# Altium footprint library CustomCase.PcbLib: 274 footprints (part 15 of 18)
Each footprint in its own frame and in the unit in brackets; x right, y up, seen from the top. Pads: shape width x height; smd on the part's side, far side on the other; paste and mask are expansions set on the pad; w line width, h text height; cw(c..) or ccw(c..) is an arc to the next point about the centre after c.
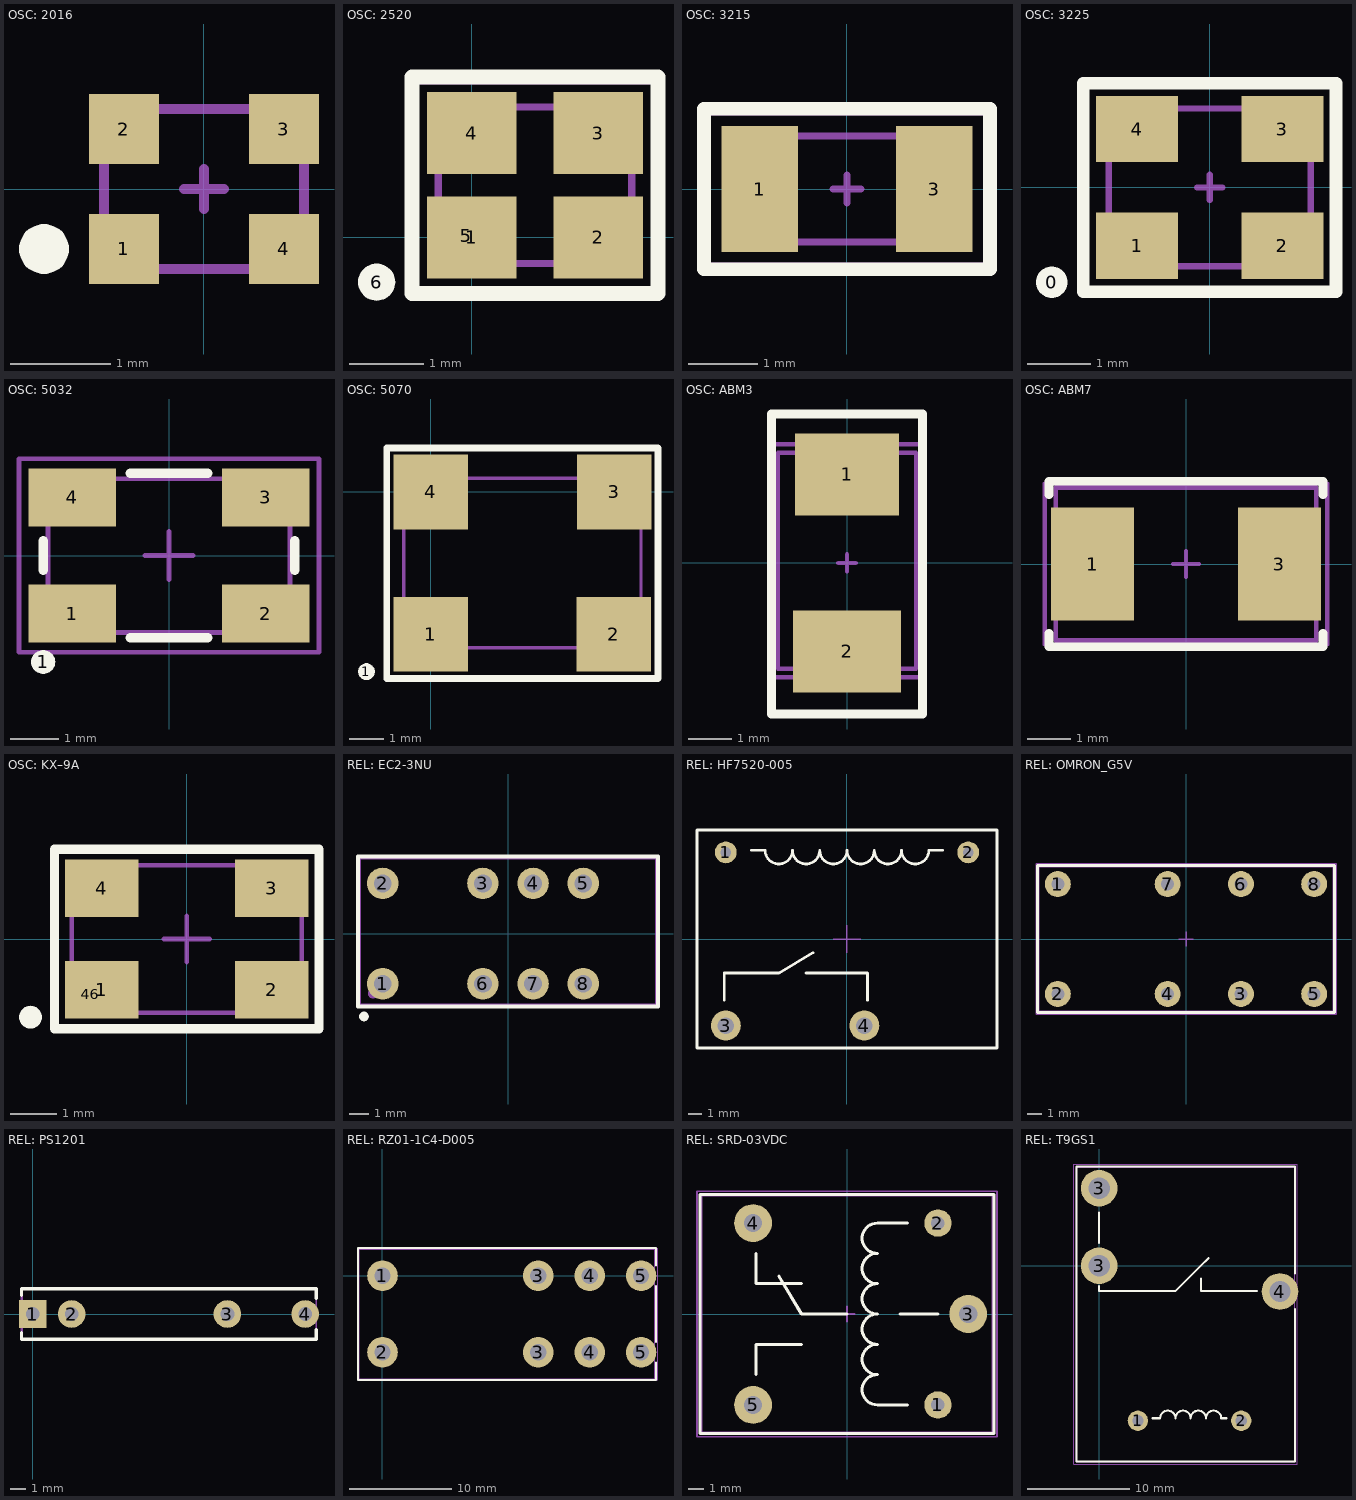
[diagram p14: the footprints below, top view; thin cyan lines are the x and y axes]

## OSC: 2016 [mm]
pads (5):
  rect 0.7x0.7 smd: 1(-0.8,-0.6) 2(-0.8,0.6) 3(0.8,0.6) 4(0.8,-0.6)
  round 0.5 on Top Overlay: ""(-1.6,-0.6)
Top Assy:
  lines w0.1: -1,-0.8 1,-0.8 1,0.8 -1,0.8 -1,-0.8
Size Area:
  lines w0.1: -0.2,0 0.2,0 ; 0,-0.2 0,0.2 ; -1,-0.8 1,-0.8 1,0.8 -1,0.8 -1,-0.8
3D body "User Library-XRCGB27M000F2P00R0.STEP": height 0.65, standoff 0, extent -1,-0.8 1,0.8

## OSC: 2520 [mm]
pads (6):
  rect 1.2x1.1 smd: 1(0,0) 2(1.7,0) 3(1.7,1.4) 4(0,1.4)
  round 0.5 on Mech1: 5(-0.075,0.025)
  round 0.5 on Top Overlay: 6(-1.275,-0.6)
Top Overlay:
  lines w0.2: -0.8,-0.75 -0.8,2.15 2.5,2.15 2.5,-0.75 -0.8,-0.75
Top Assy:
  lines w0.1: -0.45,-0.35 2.15,-0.35 2.15,1.75 -0.45,1.75 -0.45,-0.35
Size Area:
  lines w0.1: -0.8,-0.7 2.5,-0.7 2.5,2.1 -0.8,2.1 -0.8,-0.7
3D body "User Library-Crystal NDK NX2520SA series.STEP": height 0.55, standoff 0, extent -0.45,-0.35 2.15,1.75

## OSC: 3215 [mm]
pads (2):
  rect 1.1x1.8 smd: 1(-1.25,0) 3(1.25,0)
Top Overlay:
  lines w0.2: -2.05,-1.15 -2.05,1.15 2.05,1.15 2.05,-1.15 -2.05,-1.15
Top Assy:
  lines w0.1: -1.61,-0.76 1.61,-0.76 1.61,0.76 -1.61,0.76 -1.61,-0.76
Size Area:
  lines w0.1: -0.2,0 0.2,0 ; 0,-0.2 0,0.2 ; -2.05,-1.1 -2.05,1.1 2.05,1.1 2.05,-1.1 -2.05,-1.1
3D body "User Library-ABS07.STEP": height 0.91, standoff 0, extent -1.61,-0.76 1.61,0.76

## OSC: 3225 [mm]
height 0.55
pads (5):
  round 0.5 on Top Overlay: 0(-2.5,-1.5)
  rect 1.3x1.05 smd: 1(-1.15,-0.925) 2(1.15,-0.925) 3(1.15,0.925) 4(-1.15,0.925)
Top Overlay:
  lines w0.2: -2,-1.65 -2,1.65 2,1.65 2,-1.65 -2,-1.65
Top Assy:
  lines w0.1: -1.6,-1.25 1.6,-1.25 1.6,1.25 -1.6,1.25 -1.6,-1.25
Size Area:
  lines w0.1: -0.2,0 0.2,0 ; 0,-0.2 0,0.2 ; -2,-1.7 2,-1.7 2,1.6 2,1.7 -2,1.7 -2,-1.7
3D body "User Library-User Library-Siward_SX3225.step": height 0.81, standoff 0, extent -1.6,-1.25 1.6,1.25

## OSC: 5032 [mm]
pads (6):
  round 0.5 on Top Overlay: 1(-2.6,-2.2)
  rect 1.8x1.2 smd: 1(-2,-1.2) 2(2,-1.2) 3(2,1.2) 4(-2,1.2)
  round 0.5 on Mech1: ""(-2,-1.1)
Top Overlay:
  lines w0.2: -2.6,-0.3 -2.6,0.3 ; -0.8,-1.7 0.8,-1.7 ; -0.8,1.7 0.8,1.7 ; 2.6,-0.3 2.6,0.3
Top Assy:
  lines w0.1: -2.5,-1.587 -2.5,1.587 2.5,1.587 2.5,-1.587 -2.5,-1.587
Size Area:
  lines w0.1: -0.5,0 0.5,0 ; 0,-0.5 0,0.5 ; -3.1,-2 -3.1,2 3.1,2 3.1,-2 -3.1,-2
3D body "ABM3B.STEP": height 1.1, standoff -0.01, extent -2.5,-1.587 2.5,1.587

## OSC: 5070 [mm]
pads (5):
  round 0.5 on Top Overlay: 1(-1.9,-5.3)
  rect 2.2x2.2 smd: 1(0,-4.2) 2(5.4,-4.2) 3(5.41,0) 4(0,0)
Top Overlay:
  lines w0.2: -1.3,-5.5 -1.3,1.3 6.7,1.3 6.7,-5.5 -1.3,-5.5
Top Assy:
  lines w0.1: -0.8,-4.6 -0.8,0.4 6.2,0.4 6.2,-4.6 -0.8,-4.6
3D body "User Library-50 MHz.STEP": height 1.51, standoff -0.01, extent -0.8,-4.6 6.2,0.4

## OSC: ABM3 [mm] "Quartz"
height 1.5
pads (2):
  rect 2.4x1.9 smd: 1(0,2.05)
  rect 2.5x1.9 smd: 2(0,-2.05)
Top Overlay:
  lines w0.2: -1.75,-3.5 1.75,-3.5 1.75,-3.2 1.75,3.45 -1.75,3.45 -1.75,-3.5
Top Assy:
  lines w0.1: -1.6,-2.45 1.6,-2.45 1.6,2.55 -1.6,2.55 -1.6,-2.45
Size Area:
  lines w0.1: -0.2,0 0.2,0 ; 0,-0.2 0,0.2 ; -1.8,-2.65 -1.8,2.75 1.8,2.75 1.8,-2.65 -1.8,-2.65
3D body "User Library-ABM3-1.STEP": height 1.3, standoff 0, extent -1.6,-2.45 1.6,2.55

## OSC: ABM7 [mm]
pads (2):
  rect 1.9x2.6 smd: 1(-2.15,0) 3(2.15,0)
Top Overlay:
  lines w0.2: -3.15,-1.6 -3.15,-1.9 3.15,-1.9 3.15,-1.6 ; -3.15,1.6 -3.15,1.9 3.15,1.9 3.15,1.6
Top Assy:
  lines w0.1: -2.997,-1.752 -2.997,1.753 2.997,1.753 2.997,-1.752 -2.997,-1.752
Size Area:
  lines w0.1: -0.3,0 0.3,0 ; 0,-0.3 0,0.3 ; -3.25,-1.85 -3.25,1.85 3.25,1.85 3.25,-1.85 -3.25,-1.85
3D body "ABM7.STEP": height 1.4, standoff 0, extent -2.997,-1.752 2.997,1.753

## OSC: KX–9A [mm] "Quartz Crystal  KX–9A"
height 1
pads (6):
  rect 1.6x1.25 smd: 1(-1.85,-1.1) 2(1.85,-1.1) 3(1.85,1.1) 4(-1.85,1.1)
  round 0.5 on Mech1: 46(-2.1,-1.2)
  round 0.5 on Top Overlay: ""(-3.4,-1.7)
Top Overlay:
  lines w0.2: -2.875,-1.95 -2.875,1.95 2.875,1.95 2.875,-1.95 -2.875,-1.95
Top Assy:
  lines w0.1: -2.5,-1.6 2.5,-1.6 2.5,1.6 -2.5,1.6 -2.5,-1.6
Size Area:
  lines w0.1: -0.5,0 0.5,0 ; 0,-0.5 0,0.5 ; -2.85,-1.95 2.85,-1.95 2.85,1.95 -2.85,1.95 -2.85,-1.95
3D body "User Library-GeyerElectronics_KX9A.STEP": height 1.01, standoff 0, extent -2.5,-1.6 2.5,1.6

## REL: EC2-3NU [mm]
pads (10):
  round 1.6 hole 0.9: 1(-6.35,-2.54) 2(-6.35,2.54) 3(-1.27,2.54) 4(1.27,2.54) 5(3.81,2.54) 6(-1.27,-2.54) 7(1.27,-2.54) 8(3.81,-2.54)
  round 0.5 on Top Overlay: ""(-7.3,-4.2)
  round 0.5 on Mech1: ""(-6.85,-3.04)
Top Overlay:
  lines w0.2: -7.6,-3.7 -7.6,3.9 7.6,3.9 7.6,-3.7 -7.6,-3.7
Top Assy:
  lines w0.1: -7.5,-3.59 -7.5,3.81 7.5,3.81 7.5,-3.59 -7.5,-3.59
Size Area:
  lines w0.1: -7.55,-3.64 -7.55,3.86 7.55,3.86 7.55,-3.64 -7.55,-3.64
3D body "User Library-EC2-12.STEP": height 8.2, standoff -3.5, extent -7.5,-3.59 7.5,3.81

## REL: HF7520-005 [mm]
pads (4):
  round 1.6 hole 0.8: 1(-8.89,6.35) 2(8.89,6.35)
  round 2.2 hole 1.2: 3(-8.89,-6.35) 4(1.27,-6.35)
Top Overlay:
  lines w0.2: -9,-4.5 -9,-2.5 -5,-2.5 -2.5,-1 ; -7,6.5 -6,6.5 ccw(c-5,6.5) -4,6.5 ccw(c-3,6.5) -2,6.5 ccw(c-1,6.5) 0,6.5 ccw(c1,6.5) 2,6.5 ccw(c3,6.5) 4,6.5 ; -3,-2.5 1.5,-2.5 1.5,-4.5 ; 4,6.5 ccw(c5,6.5) 6,6.5 7,6.5 ; -11,-8 11,-8 11,8 -11,8 -11,-8
Top Assy:
  lines w0.1: -9,-4.5 -9,-2.5 -5,-2.5 -2.5,-1 ; -7,6.5 -6,6.5 ccw(c-5,6.5) -4,6.5 ccw(c-3,6.5) -2,6.5 ccw(c-1,6.5) 0,6.5 ccw(c1,6.5) 2,6.5 ccw(c3,6.5) 4,6.5 ccw(c5,6.5) 6,6.5 7,6.5 ; -3,-2.5 1.5,-2.5 1.5,-4.5 ; -11,-8 -11,8 11,8 11,-8 -11,-8
Size Area:
  lines w0.1: -11,-8 11,-8 11,8 -11,8 -11,-8 ; -1,0 1,0 ; 0,-1 0,1
3D body "HF7520-005 — копия.SLDPRT": height 10.9, standoff -3.7, extent -11,-8 11,8

## REL: OMRON_G5V [mm] "Omron G5V relay"
height 10
pads (8):
  round 1.8 hole 0.9: 1(-8.89,3.81) 2(-8.89,-3.81) 3(3.81,-3.81) 4(-1.27,-3.81) 5(8.89,-3.81) 6(3.81,3.81) 7(-1.27,3.81) 8(8.89,3.81)
Top Overlay:
  lines w0.2: -10.3,-5.1 10.3,-5.1 10.3,5.1 -10.3,5.1 -10.3,-5.1
Top Assy:
  lines w0.1: -10.2,-5 -10.2,5 10.2,5 10.2,-5 -10.2,-5
Size Area:
  lines w0.1: -0.5,0 0.5,0 ; 0,-0.5 0,0.5 ; -10.4,-5.207 10.4,-5.207 10.4,5.207 -10.4,5.207 -10.4,-5.207
3D body "OMRON G5V-2.step": height 10.92, standoff -4, extent -10.2,-5 10.2,5

## REL: PS1201 [mm]
height 6.35
pads (4):
  rect 1.8x1.8 hole 0.9: 1(0,0)
  round 1.8 hole 0.9: 2(2.54,0) 3(12.7,0) 4(17.78,0)
Top Overlay:
  lines w0.2: -0.75,-1.2 -0.75,-1.65 18.5,-1.65 18.5,-1 ; -0.75,1.2 -0.75,1.65 18.5,1.65 18.5,1
3D model:
  lines w0.1: -0.7,-1.65 18.5,-1.65 18.5,1.65 -0.7,1.65 -0.7,-1.65
Size Area:
  lines w0.05: -0.75,-1.65 18.5,-1.65 18.5,1.65 -0.75,1.65 -0.75,-1.65
3D body "PS1201.STEP": height 6.4, standoff -1.95, extent -0.7,-1.7 18.5,1.62

## REL: RZ01-1C4-D005 [mm]
pads (8):
  round 3 hole 1.6: 1(0,0) 2(0,-7.5) 3(15.26,-7.5) 3(15.26,0) 4(20.3,-7.5) 4(20.3,0) 5(25.34,-7.5) 5(25.34,0)
Top Overlay:
  lines w0.2: 26.8,-8.5 26.8,-10.2 -2.4,-10.2 -2.4,2.7 26.8,2.7 26.8,1 ; 26.8,-6.5 26.8,-1
Top Assy:
  lines w0.1: -2.3,-10.1 -2.3,2.6 26.7,2.6 26.7,-9.7 26.7,-10.1 -2.3,-10.1
Size Area:
  lines w0.1: -2.4,-10.2 -2.4,2.7 27,2.7 27,-10.2 -2.4,-10.2
3D body "Реле RZ01-1C4-D005.stp": height 15.9, standoff -4, extent -2.3,-10.1 26.7,2.6

## REL: SRD-03VDC [mm]
pads (5):
  round 1.8 hole 0.9: 1(6,-6) 2(6,6)
  round 2.5 hole 1.2: 3(8,0) 4(-6.2,6) 5(-6.2,-6)
Top Overlay:
  lines w0.2: -6,-4 -6,-2 -3,-2 ; -6,4 -6,2 -3,2 ; -4.5,2.5 -3,0 0,0 ; 3.5,0 6,0 ; 4,-6 2,-6 cw(c2,-5) 2,-4 cw(c2,-3) 2,-2 cw(c2,-1) 2,0 cw(c2,1) 2,2 cw(c2,3) 2,4 cw(c2,5) 2,6 4,6 ; -9.7,-7.9 -9.7,7.9 9.7,7.9 9.7,-7.9 -9.7,-7.9
Top Assy:
  lines w0.1: -6,-4 -6,-2 -3,-2 ; -6,4 -6,2 -3,2 ; -4.5,2.5 -3,0 0,0 ; 3.5,0 6,0 ; 4,-6 2,-6 cw(c2,-5) 2,-4 cw(c2,-3) 2,-2 cw(c2,-1) 2,0 cw(c2,1) 2,2 cw(c2,3) 2,4 cw(c2,5) 2,6 4,6 ; -9.6,-7.8 9.6,-7.8 9.6,7.8 -9.6,7.8 -9.6,-7.8
Size Area:
  lines w0.1: -0.5,0 0.5,0 ; 0,-0.5 0,0.5 ; -9.9,-8.1 -9.9,8.1 9.9,8.1 9.9,-8.1 -9.9,-8.1
3D body "6666.STEP": height 15.8, standoff -3, extent -9.6,-7.8 9.6,7.8

## REL: T9GS1 [mm]
pads (5):
  round 2 hole 1.1: 1(3.81,-15.24) 2(13.97,-15.24)
  round 3.6 hole 2.1: 3(0,0) 3(0,7.62) 4(17.78,-2.54)
Top Overlay:
  lines w0.2: 0,-2 0,-2.5 7.5,-2.5 10,0 ; 0,2.25 0,5.25 ; 5.25,-15 6,-15 cw(c6.75,-15) 7.5,-15 cw(c8.25,-15) 9,-15 cw(c9.75,-15) 10.5,-15 cw(c11.25,-15) 12,-15 12.5,-15 ; 10,-1.25 10,-2.5 15.5,-2.5 ; 10.75,0.75 10,0 ; 19.25,-4.25 19.25,-19.25 -2.25,-19.25 -2.25,9.75 19.25,9.75 19.25,-0.75 ; 10,0 10,0
3D model:
  lines w0.1: -2.25,-19.3 19.25,-19.3 19.25,9.7 -2.25,9.7 -2.25,-19.3
Size Area:
  lines w0.1: -2.5,-19.5 -2.5,10 19.5,10 19.5,-19.5 -2.5,-19.5
3D body "T9GS1L14-12.STEP": height 15.7, standoff -3.5, extent -2.25,-19.3 19.25,9.7